# Altium schematic symbol library Analog Devices Data Converters Digital-to-Analog Converters.SchLib: 2231 symbols (part 109 of 135)
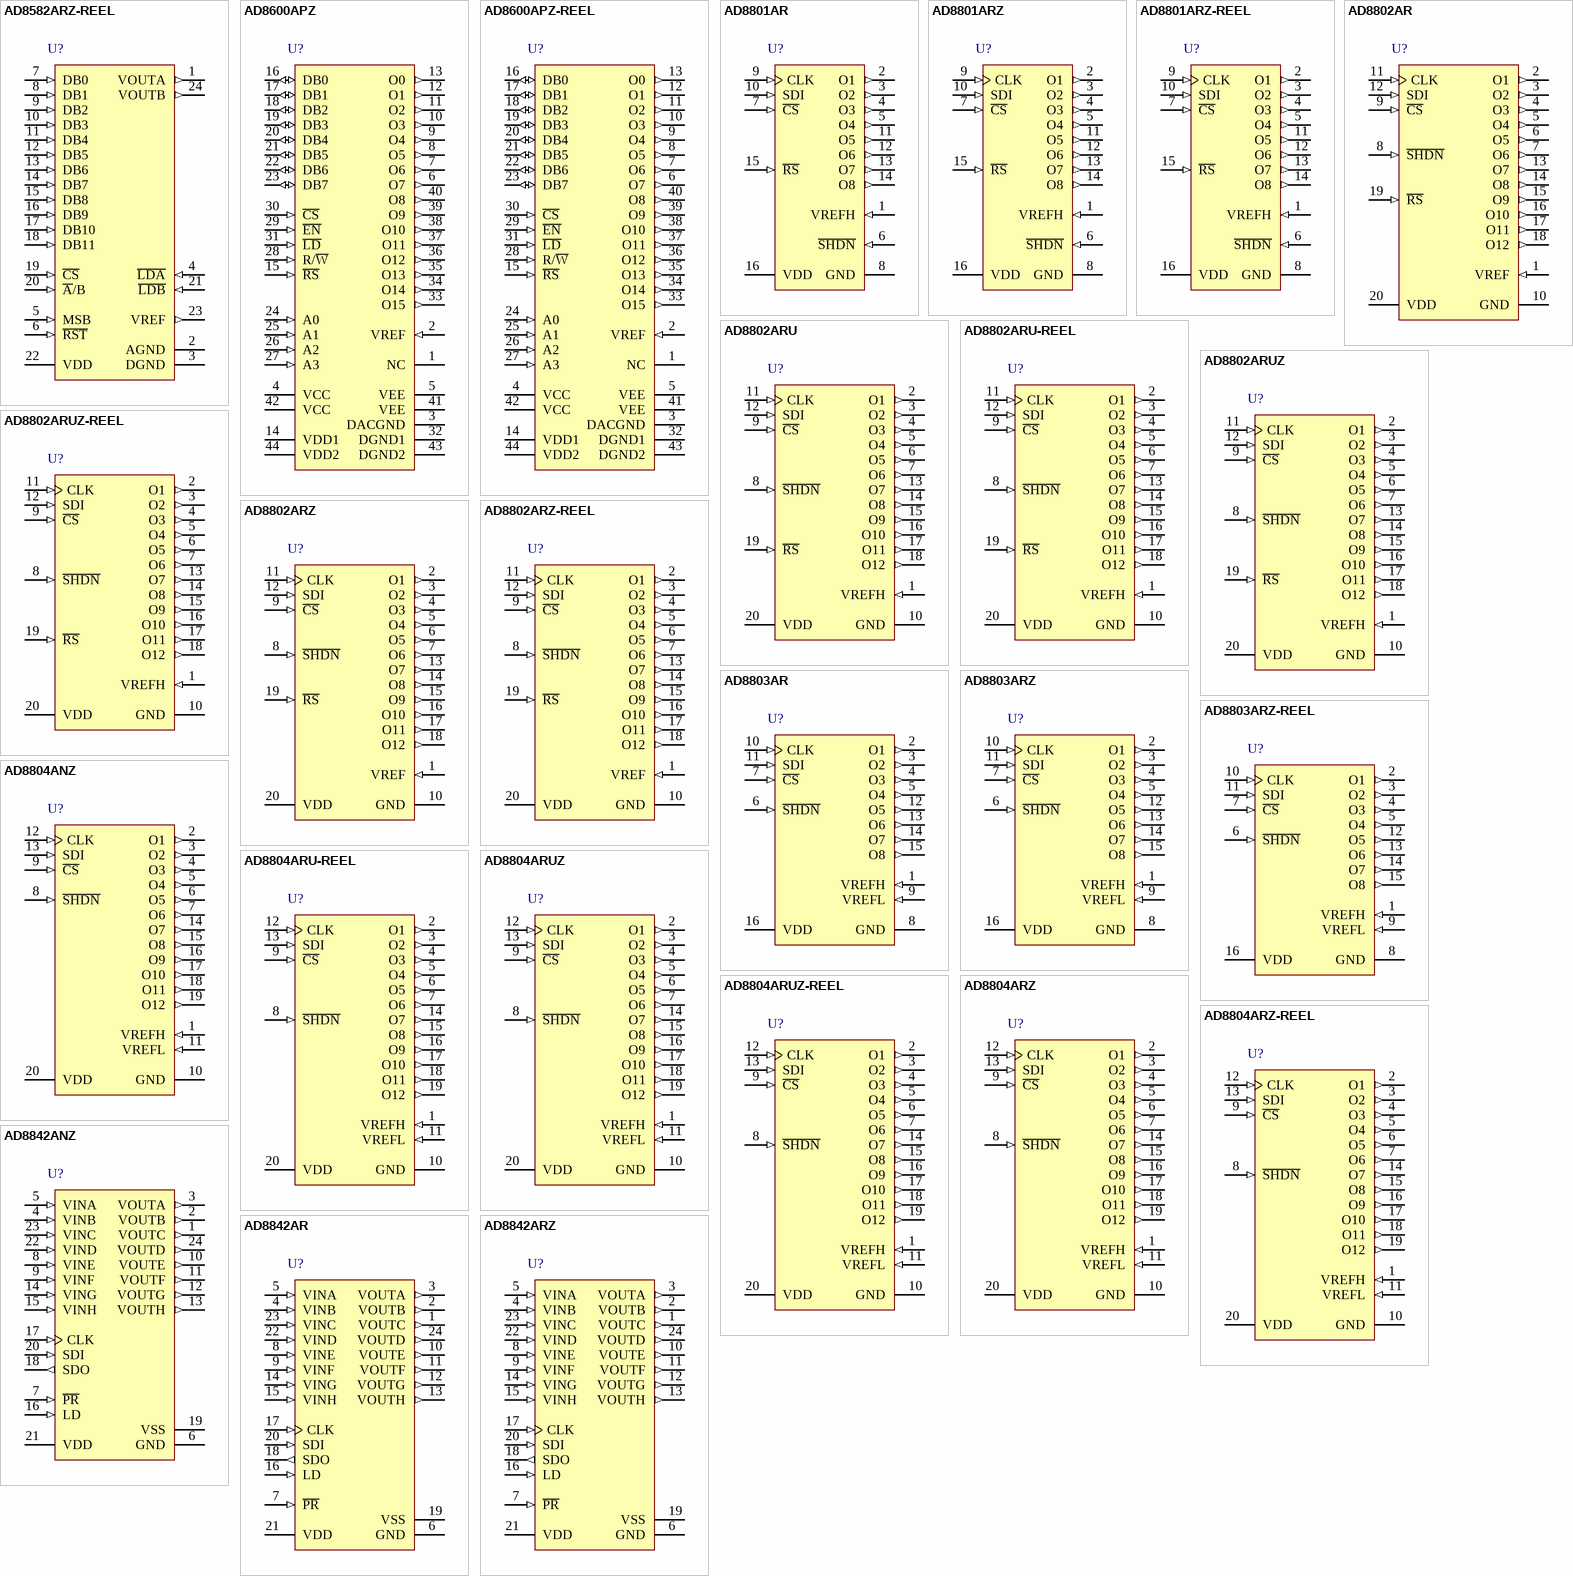
[diagram p221: symbols AD8582ARZ-REEL to AD8842ARZ]

## AD8802AR
designator U?
Dual 8-Bit MDAC with Power Shutdown, -40 to +85 degC, RW-20, Tube; Generic Part Number: AD8802; Manufacturer: Analog Devices; PartNumber: AD8802AR; # DAC Outputs: 12; Max V+: 5.5V; Op Pwr Diss: 20mW; Resolution (Bits): 8; Settling Time: 600ns; Single Supply: Yes; DatasheetVersion: Rev.0; PackageVersion: 060706-A; PackageReference: RW-20; PackageDescription: 20-Lead Standard Small Outline Package [SOIC_W] Wide Body; Supplier 1: Digi-Key; Supplier Part Number 1: AD8802AR-ND; Supplier 2: Mouser; Supplier Part Number 2: 584-AD8802AR; Packing: Tube; RoHS: N; Mounting Technology: Surface Mount; Code_JEDEC: MS-013-AC; ComponentLink1Description: Manufacturer URL; ComponentLink1URL: http://www.analog.com/en/index.html; ComponentLink2Description: Datasheet; ComponentLink2URL: http://www.analog.com/static/imported-files/data_sheets/AD8802_8804.pdf; ComponentLink3Description: Package Specification; ComponentLink3URL: http://www.analog.com/static/imported-files/packages/233848RW_20.pdf; ComponentLink4Description: Product URL; ComponentLink4URL: http://www.analog.com/en/digital-to-analog-converters/da-converters/ad8802/products/product.html
footprint RW-20_N (SOIC, 20-Leads, Body 12.8x7.5mm, Pitch 1.27mm, IPC Medium Density)
footprint RW-20_L (SOIC, 20-Leads, Body 12.8x7.5mm, Pitch 1.27mm, IPC High Density)
footprint RW-20_M (SOIC, 20-Leads, Body 12.8x7.5mm, Pitch 1.27mm, IPC Low Density)
pins: 1 VREF (in) "Common DAC Reference Input", 2 O1 (out) "DAC Output #1, addr = 0000", 3 O2 (out) "DAC Output #2, addr = 0001", 4 O3 (out) "DAC Output #3, addr = 0010", 5 O4 (out) "DAC Output #4, addr = 0011", 6 O5 (out) "DAC Output #5, addr = 0100", 7 O6 (out) "DAC Output #6, addr = 0101", 8 ~{SHDN} (in) "Reference input current goes to zero. DAC latch settings maintained", 9 ~{CS} (in) "Chip Select Input, Active Low. When C\S\ returns high, data in the serial input register is decoded based on the address bits and loaded into the target DAC register", 10 GND (power) "Ground", 11 CLK (in) "Serial Clock Input, Positive Edge Triggered", 12 SDI (in) "Serial Data Input", 13 O7 (out) "DAC Output #7, addr = 0110", 14 O8 (out) "DAC Output #8, addr = 0111", 15 O9 (out) "DAC Output #9, addr = 1000", 16 O10 (out) "DAC Output #10, addr = 1001", 17 O11 (out) "DAC Output #11, addr = 1010", 18 O12 (out) "DAC Output #12, addr = 1011", 19 ~{RS} (in) "Asynchronous Preset to Midscale Output Setting. Loads all DAC Registers with 80H", 20 VDD (power) "Positive Power Supply, Specified for Operation at Both +3 V and +5 V"

## AD8802ARU
designator U?
Dual 8-Bit MDAC with Power Shutdown, -40 to +85 degC, RU-20, Tube; Generic Part Number: AD8802; Manufacturer: Analog Devices; PartNumber: AD8802ARU; # DAC Outputs: 12; Max V+: 5.5V; Op Pwr Diss: 20mW; Resolution (Bits): 8; Settling Time: 600ns; Single Supply: Yes; DatasheetVersion: Rev.0; PackageVersion: 2000; PackageReference: RU-20; PackageDescription: 20-Lead Thin Shrink Small Outline Package [TSSOP]; Supplier 1: Digi-Key; Supplier Part Number 1: AD8802ARU-ND; Supplier 2: Mouser; Supplier Part Number 2: 584-AD8802ARU; Packing: Tube; RoHS: N; Mounting Technology: Surface Mount; Code_JEDEC: MO-153AC; ComponentLink1Description: Manufacturer URL; ComponentLink1URL: http://www.analog.com/en/index.html; ComponentLink2Description: Datasheet; ComponentLink2URL: http://www.analog.com/static/imported-files/data_sheets/AD8802_8804.pdf; ComponentLink3Description: Package Specification; ComponentLink3URL: http://www.analog.com/static/imported-files/packages/364515793657813558433715854054607941441RU20.pdf; ComponentLink4Description: Product URL; ComponentLink4URL: http://www.analog.com/en/digital-to-analog-converters/da-converters/ad8802/products/product.html
footprint RU-20_N (TSOP, 20-Leads, Body 6.5x4.4mm, Pitch 0.65mm, IPC Medium Density)
footprint RU-20_L (TSOP, 20-Leads, Body 6.5x4.4mm, Pitch 0.65mm, IPC High Density)
footprint RU-20_M (TSOP, 20-Leads, Body 6.5x4.4mm, Pitch 0.65mm, IPC Low Density)
pins: 1 VREFH (in) "Common DAC Reference Input", 2 O1 (out) "DAC Output #1, addr = 0000", 3 O2 (out) "DAC Output #2, addr = 0001", 4 O3 (out) "DAC Output #3, addr = 0010", 5 O4 (out) "DAC Output #4, addr = 0011", 6 O5 (out) "DAC Output #5, addr = 0100", 7 O6 (out) "DAC Output #6, addr = 0101", 8 ~{SHDN} (in) "Reference input current goes to zero. DAC latch settings maintained", 9 ~{CS} (in) "Chip Select Input, Active Low. When C\S\ returns high, data in the serial input register is decoded based on the address bits and loaded into the target DAC register", 10 GND (power) "Ground", 11 CLK (in) "Serial Clock Input, Positive Edge Triggered", 12 SDI (in) "Serial Data Input", 13 O7 (out) "DAC Output #7, addr = 0110", 14 O8 (out) "DAC Output #8, addr = 0111", 15 O9 (out) "DAC Output #9, addr = 1000", 16 O10 (out) "DAC Output #10, addr = 1001", 17 O11 (out) "DAC Output #11, addr = 1010", 18 O12 (out) "DAC Output #12, addr = 1011", 19 ~{RS} (in) "Asynchronous Preset to Midscale Output Setting. Loads all DAC Registers with 80H", 20 VDD (power) "Positive Power Supply, Specified for Operation at Both +3 V and +5 V"

## AD8802ARU-REEL
designator U?
Dual 8-Bit MDAC with Power Shutdown, -40 to +85 degC, RU-20, Reel; Generic Part Number: AD8802; Manufacturer: Analog Devices; PartNumber: AD8802ARU-REEL; # DAC Outputs: 12; Max V+: 5.5V; Op Pwr Diss: 20mW; Resolution (Bits): 8; Settling Time: 600ns; Single Supply: Yes; DatasheetVersion: Rev.0; PackageVersion: 2000; PackageReference: RU-20; PackageDescription: 20-Lead Thin Shrink Small Outline Package [TSSOP]; Supplier 1: Digi-Key; Supplier Part Number 1: AD8802ARU-REEL-ND; Supplier 2: Mouser; Supplier Part Number 2: 584-AD8802ARU-R; Packing: Reel; RoHS: N; Mounting Technology: Surface Mount; Code_JEDEC: MO-153AC; ComponentLink1Description: Manufacturer URL; ComponentLink1URL: http://www.analog.com/en/index.html; ComponentLink2Description: Datasheet; ComponentLink2URL: http://www.analog.com/static/imported-files/data_sheets/AD8802_8804.pdf; ComponentLink3Description: Package Specification; ComponentLink3URL: http://www.analog.com/static/imported-files/packages/364515793657813558433715854054607941441RU20.pdf; ComponentLink4Description: Product URL; ComponentLink4URL: http://www.analog.com/en/digital-to-analog-converters/da-converters/ad8802/products/product.html
footprint RU-20_N (TSOP, 20-Leads, Body 6.5x4.4mm, Pitch 0.65mm, IPC Medium Density)
footprint RU-20_L (TSOP, 20-Leads, Body 6.5x4.4mm, Pitch 0.65mm, IPC High Density)
footprint RU-20_M (TSOP, 20-Leads, Body 6.5x4.4mm, Pitch 0.65mm, IPC Low Density)
pins: 1 VREFH (in) "Common DAC Reference Input", 2 O1 (out) "DAC Output #1, addr = 0000", 3 O2 (out) "DAC Output #2, addr = 0001", 4 O3 (out) "DAC Output #3, addr = 0010", 5 O4 (out) "DAC Output #4, addr = 0011", 6 O5 (out) "DAC Output #5, addr = 0100", 7 O6 (out) "DAC Output #6, addr = 0101", 8 ~{SHDN} (in) "Reference input current goes to zero. DAC latch settings maintained", 9 ~{CS} (in) "Chip Select Input, Active Low. When C\S\ returns high, data in the serial input register is decoded based on the address bits and loaded into the target DAC register", 10 GND (power) "Ground", 11 CLK (in) "Serial Clock Input, Positive Edge Triggered", 12 SDI (in) "Serial Data Input", 13 O7 (out) "DAC Output #7, addr = 0110", 14 O8 (out) "DAC Output #8, addr = 0111", 15 O9 (out) "DAC Output #9, addr = 1000", 16 O10 (out) "DAC Output #10, addr = 1001", 17 O11 (out) "DAC Output #11, addr = 1010", 18 O12 (out) "DAC Output #12, addr = 1011", 19 ~{RS} (in) "Asynchronous Preset to Midscale Output Setting. Loads all DAC Registers with 80H", 20 VDD (power) "Positive Power Supply, Specified for Operation at Both +3 V and +5 V"

## AD8802ARUZ
designator U?
Dual 8-Bit MDAC with Power Shutdown, -40 to +85 degC, RU-20, Pb-Free, Tube; Generic Part Number: AD8802; Manufacturer: Analog Devices; PartNumber: AD8802ARUZ; # DAC Outputs: 12; Max V+: 5.5V; Op Pwr Diss: 20mW; Resolution (Bits): 8; Settling Time: 600ns; Single Supply: Yes; DatasheetVersion: Rev.0; PackageVersion: 2000; PackageReference: RU-20; PackageDescription: 20-Lead Thin Shrink Small Outline Package [TSSOP]; Supplier 1: Digi-Key; Supplier Part Number 1: AD8802ARUZ-ND; Supplier 2: Newark; Supplier Part Number 2: 59K7103; Supplier 3: Mouser; Supplier Part Number 3: 584-AD8802ARUZ; Packing: Tube; RoHS: Y; Mounting Technology: Surface Mount; Code_JEDEC: MO-153AC; ComponentLink1Description: Manufacturer URL; ComponentLink1URL: http://www.analog.com/en/index.html; ComponentLink2Description: Datasheet; ComponentLink2URL: http://www.analog.com/static/imported-files/data_sheets/AD8802_8804.pdf; ComponentLink3Description: Package Specification; ComponentLink3URL: http://www.analog.com/static/imported-files/packages/364515793657813558433715854054607941441RU20.pdf; ComponentLink4Description: Product URL; ComponentLink4URL: http://www.analog.com/en/digital-to-analog-converters/da-converters/ad8802/products/product.html
footprint RU-20_N (TSOP, 20-Leads, Body 6.5x4.4mm, Pitch 0.65mm, IPC Medium Density)
footprint RU-20_L (TSOP, 20-Leads, Body 6.5x4.4mm, Pitch 0.65mm, IPC High Density)
footprint RU-20_M (TSOP, 20-Leads, Body 6.5x4.4mm, Pitch 0.65mm, IPC Low Density)
pins: 1 VREFH (in) "Common DAC Reference Input", 2 O1 (out) "DAC Output #1, addr = 0000", 3 O2 (out) "DAC Output #2, addr = 0001", 4 O3 (out) "DAC Output #3, addr = 0010", 5 O4 (out) "DAC Output #4, addr = 0011", 6 O5 (out) "DAC Output #5, addr = 0100", 7 O6 (out) "DAC Output #6, addr = 0101", 8 ~{SHDN} (in) "Reference input current goes to zero. DAC latch settings maintained", 9 ~{CS} (in) "Chip Select Input, Active Low. When C\S\ returns high, data in the serial input register is decoded based on the address bits and loaded into the target DAC register", 10 GND (power) "Ground", 11 CLK (in) "Serial Clock Input, Positive Edge Triggered", 12 SDI (in) "Serial Data Input", 13 O7 (out) "DAC Output #7, addr = 0110", 14 O8 (out) "DAC Output #8, addr = 0111", 15 O9 (out) "DAC Output #9, addr = 1000", 16 O10 (out) "DAC Output #10, addr = 1001", 17 O11 (out) "DAC Output #11, addr = 1010", 18 O12 (out) "DAC Output #12, addr = 1011", 19 ~{RS} (in) "Asynchronous Preset to Midscale Output Setting. Loads all DAC Registers with 80H", 20 VDD (power) "Positive Power Supply, Specified for Operation at Both +3 V and +5 V"

## AD8802ARUZ-REEL
designator U?
Dual 8-Bit MDAC with Power Shutdown, -40 to +85 degC, RU-20, Pb-Free, Reel; Generic Part Number: AD8802; Manufacturer: Analog Devices; PartNumber: AD8802ARUZ-REEL; # DAC Outputs: 12; Max V+: 5.5V; Op Pwr Diss: 20mW; Resolution (Bits): 8; Settling Time: 600ns; Single Supply: Yes; DatasheetVersion: Rev.0; PackageVersion: 2000; PackageReference: RU-20; PackageDescription: 20-Lead Thin Shrink Small Outline Package [TSSOP]; Supplier 1: Digi-Key; Supplier Part Number 1: AD8802ARUZ-REEL-ND; Supplier 2: Mouser; Supplier Part Number 2: 584-AD8802ARUZ-R; Packing: Reel; RoHS: Y; Mounting Technology: Surface Mount; Code_JEDEC: MO-153AC; ComponentLink1Description: Manufacturer URL; ComponentLink1URL: http://www.analog.com/en/index.html; ComponentLink2Description: Datasheet; ComponentLink2URL: http://www.analog.com/static/imported-files/data_sheets/AD8802_8804.pdf; ComponentLink3Description: Package Specification; ComponentLink3URL: http://www.analog.com/static/imported-files/packages/364515793657813558433715854054607941441RU20.pdf; ComponentLink4Description: Product URL; ComponentLink4URL: http://www.analog.com/en/digital-to-analog-converters/da-converters/ad8802/products/product.html
footprint RU-20_N (TSOP, 20-Leads, Body 6.5x4.4mm, Pitch 0.65mm, IPC Medium Density)
footprint RU-20_L (TSOP, 20-Leads, Body 6.5x4.4mm, Pitch 0.65mm, IPC High Density)
footprint RU-20_M (TSOP, 20-Leads, Body 6.5x4.4mm, Pitch 0.65mm, IPC Low Density)
pins: 1 VREFH (in) "Common DAC Reference Input", 2 O1 (out) "DAC Output #1, addr = 0000", 3 O2 (out) "DAC Output #2, addr = 0001", 4 O3 (out) "DAC Output #3, addr = 0010", 5 O4 (out) "DAC Output #4, addr = 0011", 6 O5 (out) "DAC Output #5, addr = 0100", 7 O6 (out) "DAC Output #6, addr = 0101", 8 ~{SHDN} (in) "Reference input current goes to zero. DAC latch settings maintained", 9 ~{CS} (in) "Chip Select Input, Active Low. When C\S\ returns high, data in the serial input register is decoded based on the address bits and loaded into the target DAC register", 10 GND (power) "Ground", 11 CLK (in) "Serial Clock Input, Positive Edge Triggered", 12 SDI (in) "Serial Data Input", 13 O7 (out) "DAC Output #7, addr = 0110", 14 O8 (out) "DAC Output #8, addr = 0111", 15 O9 (out) "DAC Output #9, addr = 1000", 16 O10 (out) "DAC Output #10, addr = 1001", 17 O11 (out) "DAC Output #11, addr = 1010", 18 O12 (out) "DAC Output #12, addr = 1011", 19 ~{RS} (in) "Asynchronous Preset to Midscale Output Setting. Loads all DAC Registers with 80H", 20 VDD (power) "Positive Power Supply, Specified for Operation at Both +3 V and +5 V"

## AD8802ARZ
designator U?
Dual 8-Bit MDAC with Power Shutdown, -40 to +85 degC, RW-20, Pb-Free, Tube; Generic Part Number: AD8802; Manufacturer: Analog Devices; PartNumber: AD8802ARZ; # DAC Outputs: 12; Max V+: 5.5V; Op Pwr Diss: 20mW; Resolution (Bits): 8; Settling Time: 600ns; Single Supply: Yes; DatasheetVersion: Rev.0; PackageVersion: 060706-A; PackageReference: RW-20; PackageDescription: 20-Lead Standard Small Outline Package [SOIC_W] Wide Body; Supplier 1: Digi-Key; Supplier Part Number 1: AD8802ARZ-ND; Supplier 2: Newark; Supplier Part Number 2: 59K7105; Supplier 3: Mouser; Supplier Part Number 3: 584-AD8802ARZ; Packing: Tube; RoHS: Y; Mounting Technology: Surface Mount; Code_JEDEC: MS-013-AC; ComponentLink1Description: Manufacturer URL; ComponentLink1URL: http://www.analog.com/en/index.html; ComponentLink2Description: Datasheet; ComponentLink2URL: http://www.analog.com/static/imported-files/data_sheets/AD8802_8804.pdf; ComponentLink3Description: Package Specification; ComponentLink3URL: http://www.analog.com/static/imported-files/packages/233848RW_20.pdf; ComponentLink4Description: Product URL; ComponentLink4URL: http://www.analog.com/en/digital-to-analog-converters/da-converters/ad8802/products/product.html
footprint RW-20_N (SOIC, 20-Leads, Body 12.8x7.5mm, Pitch 1.27mm, IPC Medium Density)
footprint RW-20_L (SOIC, 20-Leads, Body 12.8x7.5mm, Pitch 1.27mm, IPC High Density)
footprint RW-20_M (SOIC, 20-Leads, Body 12.8x7.5mm, Pitch 1.27mm, IPC Low Density)
pins: 1 VREF (in) "Common DAC Reference Input", 2 O1 (out) "DAC Output #1, addr = 0000", 3 O2 (out) "DAC Output #2, addr = 0001", 4 O3 (out) "DAC Output #3, addr = 0010", 5 O4 (out) "DAC Output #4, addr = 0011", 6 O5 (out) "DAC Output #5, addr = 0100", 7 O6 (out) "DAC Output #6, addr = 0101", 8 ~{SHDN} (in) "Reference input current goes to zero. DAC latch settings maintained", 9 ~{CS} (in) "Chip Select Input, Active Low. When C\S\ returns high, data in the serial input register is decoded based on the address bits and loaded into the target DAC register", 10 GND (power) "Ground", 11 CLK (in) "Serial Clock Input, Positive Edge Triggered", 12 SDI (in) "Serial Data Input", 13 O7 (out) "DAC Output #7, addr = 0110", 14 O8 (out) "DAC Output #8, addr = 0111", 15 O9 (out) "DAC Output #9, addr = 1000", 16 O10 (out) "DAC Output #10, addr = 1001", 17 O11 (out) "DAC Output #11, addr = 1010", 18 O12 (out) "DAC Output #12, addr = 1011", 19 ~{RS} (in) "Asynchronous Preset to Midscale Output Setting. Loads all DAC Registers with 80H", 20 VDD (power) "Positive Power Supply, Specified for Operation at Both +3 V and +5 V"

## AD8802ARZ-REEL
designator U?
Dual 8-Bit MDAC with Power Shutdown, -40 to +85 degC, RW-20, Pb-Free, Reel; Generic Part Number: AD8802; Manufacturer: Analog Devices; PartNumber: AD8802ARZ-REEL; # DAC Outputs: 12; Max V+: 5.5V; Op Pwr Diss: 20mW; Resolution (Bits): 8; Settling Time: 600ns; Single Supply: Yes; DatasheetVersion: Rev.0; PackageVersion: 060706-A; PackageReference: RW-20; PackageDescription: 20-Lead Standard Small Outline Package [SOIC_W] Wide Body; Supplier 1: Digi-Key; Supplier Part Number 1: AD8802ARZ-REEL-ND; Supplier 2: Mouser; Supplier Part Number 2: 584-AD8802ARZ-R; Packing: Reel; RoHS: Y; Mounting Technology: Surface Mount; Code_JEDEC: MS-013-AC; ComponentLink1Description: Manufacturer URL; ComponentLink1URL: http://www.analog.com/en/index.html; ComponentLink2Description: Datasheet; ComponentLink2URL: http://www.analog.com/static/imported-files/data_sheets/AD8802_8804.pdf; ComponentLink3Description: Package Specification; ComponentLink3URL: http://www.analog.com/static/imported-files/packages/233848RW_20.pdf; ComponentLink4Description: Product URL; ComponentLink4URL: http://www.analog.com/en/digital-to-analog-converters/da-converters/ad8802/products/product.html
footprint RW-20_N (SOIC, 20-Leads, Body 12.8x7.5mm, Pitch 1.27mm, IPC Medium Density)
footprint RW-20_L (SOIC, 20-Leads, Body 12.8x7.5mm, Pitch 1.27mm, IPC High Density)
footprint RW-20_M (SOIC, 20-Leads, Body 12.8x7.5mm, Pitch 1.27mm, IPC Low Density)
pins: 1 VREF (in) "Common DAC Reference Input", 2 O1 (out) "DAC Output #1, addr = 0000", 3 O2 (out) "DAC Output #2, addr = 0001", 4 O3 (out) "DAC Output #3, addr = 0010", 5 O4 (out) "DAC Output #4, addr = 0011", 6 O5 (out) "DAC Output #5, addr = 0100", 7 O6 (out) "DAC Output #6, addr = 0101", 8 ~{SHDN} (in) "Reference input current goes to zero. DAC latch settings maintained", 9 ~{CS} (in) "Chip Select Input, Active Low. When C\S\ returns high, data in the serial input register is decoded based on the address bits and loaded into the target DAC register", 10 GND (power) "Ground", 11 CLK (in) "Serial Clock Input, Positive Edge Triggered", 12 SDI (in) "Serial Data Input", 13 O7 (out) "DAC Output #7, addr = 0110", 14 O8 (out) "DAC Output #8, addr = 0111", 15 O9 (out) "DAC Output #9, addr = 1000", 16 O10 (out) "DAC Output #10, addr = 1001", 17 O11 (out) "DAC Output #11, addr = 1010", 18 O12 (out) "DAC Output #12, addr = 1011", 19 ~{RS} (in) "Asynchronous Preset to Midscale Output Setting. Loads all DAC Registers with 80H", 20 VDD (power) "Positive Power Supply, Specified for Operation at Both +3 V and +5 V"

## AD8803AR
designator U?
Octal 8-Bit MDAC with Power Shutdown, -40 to +85 degC, R-16, Tube; Generic Part Number: AD8803; Manufacturer: Analog Devices; PartNumber: AD8803AR; # DAC Outputs: 8; Max V+: 5.5V; Op Pwr Diss: 20mW; Settling Time: 600ns; Single Supply: Yes; DatasheetVersion: Rev.A; PackageVersion: 060606-A; PackageReference: R-16; PackageDescription: 16-Lead Standard Small Outline Package [SOIC_N] Narrow Body; Supplier 1: Digi-Key; Supplier Part Number 1: AD8803AR-ND; Supplier 2: Mouser; Supplier Part Number 2: 584-AD8803AR; Packing: Tube; Resolution (Bits): 8; RoHS: N; Mounting Technology: Surface Mount; Code_JEDEC: MS-012-AC; ComponentLink1Description: Manufacturer URL; ComponentLink1URL: http://www.analog.com/en/index.html; ComponentLink2Description: Datasheet; ComponentLink2URL: http://www.analog.com/static/imported-files/data_sheets/AD8801_8803.pdf; ComponentLink3Description: Package Specification; ComponentLink3URL: http://www.analog.com/static/imported-files/packages/PKG_PDF/SOIC_Narrow%20(R)/R_16.pdf; ComponentLink4Description: Product URL; ComponentLink4URL: http://www.analog.com/en/digital-to-analog-converters/da-converters/ad8803/products/product.html
footprint R-16_N (SOIC, 16-Leads, Body 9.9x3.9mm, Pitch 1.27mm, IPC Medium Density)
footprint R-16_L (SOIC, 16-Leads, Body 9.9x3.9mm, Pitch 1.27mm, IPC High Density)
footprint R-16_M (SOIC, 16-Leads, Body 9.9x3.9mm, Pitch 1.27mm, IPC Low Density)
pins: 1 VREFH (in) "Common High-Side DAC Reference Input", 2 O1 (out) "DAC Output #1, Addr = 000.", 3 O2 (out) "DAC Output #2, Addr = 001.", 4 O3 (out) "DAC Output #3, Addr = 010.", 5 O4 (out) "DAC Output #4, Addr = 011.", 6 ~{SHDN} (in) "Reference inputs open circuit, active low, all DAC outputs open circuit. DAC latch settings maintained.", 7 ~{CS} (in) "Chip Select Input, active low. When C\S\ returns high, data in the serial input register is decoded based on the address bits and loaded into the target DAC register.", 8 GND (power) "Ground", 9 VREFL (in) "Common Low-Side DAC Reference Input", 10 CLK (in) "Serial Clock Input, Positive Edge Triggered", 11 SDI (in) "Serial Data Input", 12 O5 (out) "DAC Output #5, Addr = 100.", 13 O6 (out) "DAC Output #6, Addr = 101.", 14 O7 (out) "DAC Output #7, Addr = 110.", 15 O8 (out) "DAC Output #8, Addr = 111.", 16 VDD (power) "Positive power supply, specified for operation at both +3 V and +5 V."

## AD8803ARZ
designator U?
Octal 8-Bit MDAC with Power Shutdown, -40 to +85 degC, R-16, Pb-Free, Tube; Generic Part Number: AD8803; Manufacturer: Analog Devices; PartNumber: AD8803ARZ; # DAC Outputs: 8; Max V+: 5.5V; Op Pwr Diss: 20mW; Settling Time: 600ns; Single Supply: Yes; DatasheetVersion: Rev.A; PackageVersion: 060606-A; PackageReference: R-16; PackageDescription: 16-Lead Standard Small Outline Package [SOIC_N] Narrow Body; Supplier 1: Digi-Key; Supplier Part Number 1: AD8803ARZ-ND; Supplier 2: Farnell; Supplier Part Number 2: 1438630; Supplier 3: Newark; Supplier Part Number 3: 59K7107; Supplier 4: Mouser; Supplier Part Number 4: 584-AD8803ARZ; Packing: Tube; Resolution (Bits): 8; RoHS: Y; Mounting Technology: Surface Mount; Code_JEDEC: MS-012-AC; ComponentLink1Description: Manufacturer URL; ComponentLink1URL: http://www.analog.com/en/index.html; ComponentLink2Description: Datasheet; ComponentLink2URL: http://www.analog.com/static/imported-files/data_sheets/AD8801_8803.pdf; ComponentLink3Description: Package Specification; ComponentLink3URL: http://www.analog.com/static/imported-files/packages/PKG_PDF/SOIC_Narrow%20(R)/R_16.pdf; ComponentLink4Description: Product URL; ComponentLink4URL: http://www.analog.com/en/digital-to-analog-converters/da-converters/ad8803/products/product.html
footprint R-16_N (SOIC, 16-Leads, Body 9.9x3.9mm, Pitch 1.27mm, IPC Medium Density)
footprint R-16_L (SOIC, 16-Leads, Body 9.9x3.9mm, Pitch 1.27mm, IPC High Density)
footprint R-16_M (SOIC, 16-Leads, Body 9.9x3.9mm, Pitch 1.27mm, IPC Low Density)
pins: 1 VREFH (in) "Common High-Side DAC Reference Input", 2 O1 (out) "DAC Output #1, Addr = 000.", 3 O2 (out) "DAC Output #2, Addr = 001.", 4 O3 (out) "DAC Output #3, Addr = 010.", 5 O4 (out) "DAC Output #4, Addr = 011.", 6 ~{SHDN} (in) "Reference inputs open circuit, active low, all DAC outputs open circuit. DAC latch settings maintained.", 7 ~{CS} (in) "Chip Select Input, active low. When C\S\ returns high, data in the serial input register is decoded based on the address bits and loaded into the target DAC register.", 8 GND (power) "Ground", 9 VREFL (in) "Common Low-Side DAC Reference Input", 10 CLK (in) "Serial Clock Input, Positive Edge Triggered", 11 SDI (in) "Serial Data Input", 12 O5 (out) "DAC Output #5, Addr = 100.", 13 O6 (out) "DAC Output #6, Addr = 101.", 14 O7 (out) "DAC Output #7, Addr = 110.", 15 O8 (out) "DAC Output #8, Addr = 111.", 16 VDD (power) "Positive power supply, specified for operation at both +3 V and +5 V."

## AD8803ARZ-REEL
designator U?
Octal 8-Bit MDAC with Power Shutdown, -40 to +85 degC, R-16, Pb-Free, Reel; Generic Part Number: AD8803; Manufacturer: Analog Devices; PartNumber: AD8803ARZ-REEL; # DAC Outputs: 8; Max V+: 5.5V; Op Pwr Diss: 20mW; Settling Time: 600ns; Single Supply: Yes; DatasheetVersion: Rev.A; PackageVersion: 060606-A; PackageReference: R-16; PackageDescription: 16-Lead Standard Small Outline Package [SOIC_N] Narrow Body; Supplier 1: Digi-Key; Supplier Part Number 1: AD8803ARZ-REEL-ND; Supplier 2: Mouser; Supplier Part Number 2: 584-AD8803ARZ-R; Packing: Reel; Resolution (Bits): 8; RoHS: Y; Mounting Technology: Surface Mount; Code_JEDEC: MS-012-AC; ComponentLink1Description: Manufacturer URL; ComponentLink1URL: http://www.analog.com/en/index.html; ComponentLink2Description: Datasheet; ComponentLink2URL: http://www.analog.com/static/imported-files/data_sheets/AD8801_8803.pdf; ComponentLink3Description: Package Specification; ComponentLink3URL: http://www.analog.com/static/imported-files/packages/PKG_PDF/SOIC_Narrow%20(R)/R_16.pdf; ComponentLink4Description: Product URL; ComponentLink4URL: http://www.analog.com/en/digital-to-analog-converters/da-converters/ad8803/products/product.html
footprint R-16_N (SOIC, 16-Leads, Body 9.9x3.9mm, Pitch 1.27mm, IPC Medium Density)
footprint R-16_L (SOIC, 16-Leads, Body 9.9x3.9mm, Pitch 1.27mm, IPC High Density)
footprint R-16_M (SOIC, 16-Leads, Body 9.9x3.9mm, Pitch 1.27mm, IPC Low Density)
pins: 1 VREFH (in) "Common High-Side DAC Reference Input", 2 O1 (out) "DAC Output #1, Addr = 000.", 3 O2 (out) "DAC Output #2, Addr = 001.", 4 O3 (out) "DAC Output #3, Addr = 010.", 5 O4 (out) "DAC Output #4, Addr = 011.", 6 ~{SHDN} (in) "Reference inputs open circuit, active low, all DAC outputs open circuit. DAC latch settings maintained.", 7 ~{CS} (in) "Chip Select Input, active low. When C\S\ returns high, data in the serial input register is decoded based on the address bits and loaded into the target DAC register.", 8 GND (power) "Ground", 9 VREFL (in) "Common Low-Side DAC Reference Input", 10 CLK (in) "Serial Clock Input, Positive Edge Triggered", 11 SDI (in) "Serial Data Input", 12 O5 (out) "DAC Output #5, Addr = 100.", 13 O6 (out) "DAC Output #6, Addr = 101.", 14 O7 (out) "DAC Output #7, Addr = 110.", 15 O8 (out) "DAC Output #8, Addr = 111.", 16 VDD (power) "Positive power supply, specified for operation at both +3 V and +5 V."

## AD8804ANZ
designator U?
Dual 8-Bit MDAC with Power Shutdown, -40 to +85 degC, N-20, Pb-Free, Tube; Generic Part Number: AD8804; Manufacturer: Analog Devices; PartNumber: AD8804ANZ; # DAC Outputs: 12; Max V+: 5.5V; Op Pwr Diss: 20mW; Resolution (Bits): 8; Settling Time: 600ns; Single Supply: Yes; DatasheetVersion: Rev.0; PackageVersion: 070706-A; PackageReference: N-20; PackageDescription: 20-Lead Plastic Dual In-Line Package [PDIP] Narrow Body; Supplier 1: Digi-Key; Supplier Part Number 1: AD8804ANZ-ND; Supplier 2: Newark; Supplier Part Number 2: 12M9169; Supplier 3: Mouser; Supplier Part Number 3: 584-AD8804ANZ; Packing: Tube; RoHS: Y; Mounting Technology: Through Hole; Code_JEDEC: MS-001; ComponentLink1Description: Manufacturer URL; ComponentLink1URL: http://www.analog.com/en/index.html; ComponentLink2Description: Datasheet; ComponentLink2URL: http://www.analog.com/static/imported-files/data_sheets/AD8802_8804.pdf; ComponentLink3Description: Package Specification; ComponentLink3URL: http://www.analog.com/static/imported-files/packages/50601349676519N_20.pdf; ComponentLink4Description: Product URL; ComponentLink4URL: http://www.analog.com/en/digital-to-analog-converters/da-converters/ad8804/products/product.html
footprint N-20 (DIP, 20-Leads, Row Spacing 7.62mm, Pitch 2.54mm, Body 25.9x6.6mm)
pins: 1 VREFH (in) "Common High-Side DAC Reference Input", 2 O1 (out) "DAC Output #1, addr = 0000", 3 O2 (out) "DAC Output #2, addr = 0001", 4 O3 (out) "DAC Output #3, addr = 0010", 5 O4 (out) "DAC Output #4, addr = 0011", 6 O5 (out) "DAC Output #5, addr = 0100", 7 O6 (out) "DAC Output #6, addr = 0101", 8 ~{SHDN} (in) "Reference input current goes to zero. DAC latch settings maintained", 9 ~{CS} (in) "Chip Select Input, Active Low. When C\S\ returns high, data in the serial input register is decoded based on the address bits and loaded into the target DAC register", 10 GND (power) "Ground", 11 VREFL (in) "Common Low-Side DAC Reference Input", 12 CLK (in) "Serial Clock Input, Positive Edge Triggered", 13 SDI (in) "Serial Data Input", 14 O7 (out) "DAC Output #7, addr = 0110", 15 O8 (out) "DAC Output #8, addr = 0111", 16 O9 (out) "DAC Output #9, addr = 1000", 17 O10 (out) "DAC Output #10, addr = 1001", 18 O11 (out) "DAC Output #11, addr = 1010", 19 O12 (out) "DAC Output #12, addr = 1011", 20 VDD (power) "Positive power supply, specified for operation at both +3 V and +5 V"

## AD8804ARU-REEL
designator U?
Dual 8-Bit MDAC with Power Shutdown, -40 to +85 degC, RU-20, Reel; Generic Part Number: AD8804; Manufacturer: Analog Devices; PartNumber: AD8804ARU-REEL; # DAC Outputs: 12; Max V+: 5.5V; Op Pwr Diss: 20mW; Resolution (Bits): 8; Settling Time: 600ns; Single Supply: Yes; DatasheetVersion: Rev.0; PackageVersion: 2000; PackageReference: RU-20; PackageDescription: 20-Lead Thin Shrink Small Outline Package [TSSOP]; Supplier 1: Mouser; Supplier Part Number 1: N/A; Packing: Reel; RoHS: N; Mounting Technology: Surface Mount; Code_JEDEC: MO-153AC; ComponentLink1Description: Manufacturer URL; ComponentLink1URL: http://www.analog.com/en/index.html; ComponentLink2Description: Datasheet; ComponentLink2URL: http://www.analog.com/static/imported-files/data_sheets/AD8802_8804.pdf; ComponentLink3Description: Package Specification; ComponentLink3URL: http://www.analog.com/static/imported-files/packages/364515793657813558433715854054607941441RU20.pdf; ComponentLink4Description: Product URL; ComponentLink4URL: http://www.analog.com/en/digital-to-analog-converters/da-converters/ad8804/products/product.html
footprint RU-20_N (TSOP, 20-Leads, Body 6.5x4.4mm, Pitch 0.65mm, IPC Medium Density)
footprint RU-20_L (TSOP, 20-Leads, Body 6.5x4.4mm, Pitch 0.65mm, IPC High Density)
footprint RU-20_M (TSOP, 20-Leads, Body 6.5x4.4mm, Pitch 0.65mm, IPC Low Density)
pins: 1 VREFH (in) "Common High-Side DAC Reference Input", 2 O1 (out) "DAC Output #1, addr = 0000", 3 O2 (out) "DAC Output #2, addr = 0001", 4 O3 (out) "DAC Output #3, addr = 0010", 5 O4 (out) "DAC Output #4, addr = 0011", 6 O5 (out) "DAC Output #5, addr = 0100", 7 O6 (out) "DAC Output #6, addr = 0101", 8 ~{SHDN} (in) "Reference input current goes to zero. DAC latch settings maintained", 9 ~{CS} (in) "Chip Select Input, Active Low. When C\S\ returns high, data in the serial input register is decoded based on the address bits and loaded into the target DAC register", 10 GND (power) "Ground", 11 VREFL (in) "Common Low-Side DAC Reference Input", 12 CLK (in) "Serial Clock Input, Positive Edge Triggered", 13 SDI (in) "Serial Data Input", 14 O7 (out) "DAC Output #7, addr = 0110", 15 O8 (out) "DAC Output #8, addr = 0111", 16 O9 (out) "DAC Output #9, addr = 1000", 17 O10 (out) "DAC Output #10, addr = 1001", 18 O11 (out) "DAC Output #11, addr = 1010", 19 O12 (out) "DAC Output #12, addr = 1011", 20 VDD (power) "Positive Power Supply, Specified for Operation at Both +3 V and +5 V"

## AD8804ARUZ
designator U?
Dual 8-Bit MDAC with Power Shutdown, -40 to +85 degC, RU-20, Pb-Free, Tube; Generic Part Number: AD8804; Manufacturer: Analog Devices; PartNumber: AD8804ARUZ; # DAC Outputs: 12; Max V+: 5.5V; Op Pwr Diss: 20mW; Resolution (Bits): 8; Settling Time: 600ns; Single Supply: Yes; DatasheetVersion: Rev.0; PackageVersion: 2000; PackageReference: RU-20; PackageDescription: 20-Lead Thin Shrink Small Outline Package [TSSOP]; Supplier 1: Digi-Key; Supplier Part Number 1: AD8804ARUZ-ND; Supplier 2: Mouser; Supplier Part Number 2: 584-AD8804ARUZ; Packing: Tube; RoHS: Y; Mounting Technology: Surface Mount; Code_JEDEC: MO-153AC; ComponentLink1Description: Manufacturer URL; ComponentLink1URL: http://www.analog.com/en/index.html; ComponentLink2Description: Datasheet; ComponentLink2URL: http://www.analog.com/static/imported-files/data_sheets/AD8802_8804.pdf; ComponentLink3Description: Package Specification; ComponentLink3URL: http://www.analog.com/static/imported-files/packages/364515793657813558433715854054607941441RU20.pdf; ComponentLink4Description: Product URL; ComponentLink4URL: http://www.analog.com/en/digital-to-analog-converters/da-converters/ad8804/products/product.html
footprint RU-20_N (TSOP, 20-Leads, Body 6.5x4.4mm, Pitch 0.65mm, IPC Medium Density)
footprint RU-20_L (TSOP, 20-Leads, Body 6.5x4.4mm, Pitch 0.65mm, IPC High Density)
footprint RU-20_M (TSOP, 20-Leads, Body 6.5x4.4mm, Pitch 0.65mm, IPC Low Density)
pins: 1 VREFH (in) "Common High-Side DAC Reference Input", 2 O1 (out) "DAC Output #1, addr = 0000", 3 O2 (out) "DAC Output #2, addr = 0001", 4 O3 (out) "DAC Output #3, addr = 0010", 5 O4 (out) "DAC Output #4, addr = 0011", 6 O5 (out) "DAC Output #5, addr = 0100", 7 O6 (out) "DAC Output #6, addr = 0101", 8 ~{SHDN} (in) "Reference input current goes to zero. DAC latch settings maintained", 9 ~{CS} (in) "Chip Select Input, Active Low. When C\S\ returns high, data in the serial input register is decoded based on the address bits and loaded into the target DAC register", 10 GND (power) "Ground", 11 VREFL (in) "Common Low-Side DAC Reference Input", 12 CLK (in) "Serial Clock Input, Positive Edge Triggered", 13 SDI (in) "Serial Data Input", 14 O7 (out) "DAC Output #7, addr = 0110", 15 O8 (out) "DAC Output #8, addr = 0111", 16 O9 (out) "DAC Output #9, addr = 1000", 17 O10 (out) "DAC Output #10, addr = 1001", 18 O11 (out) "DAC Output #11, addr = 1010", 19 O12 (out) "DAC Output #12, addr = 1011", 20 VDD (power) "Positive Power Supply, Specified for Operation at Both +3 V and +5 V"